# Altium footprint library Twomes_Monitor_PCB.PcbLib: 8 footprints
Each footprint in its own frame and in the unit in brackets; x right, y up, seen from the top. Pads: shape width x height; smd on the part's side, far side on the other; paste and mask are expansions set on the pad; w line width, h text height; cw(c..) or ccw(c..) is an arc to the next point about the centre after c.
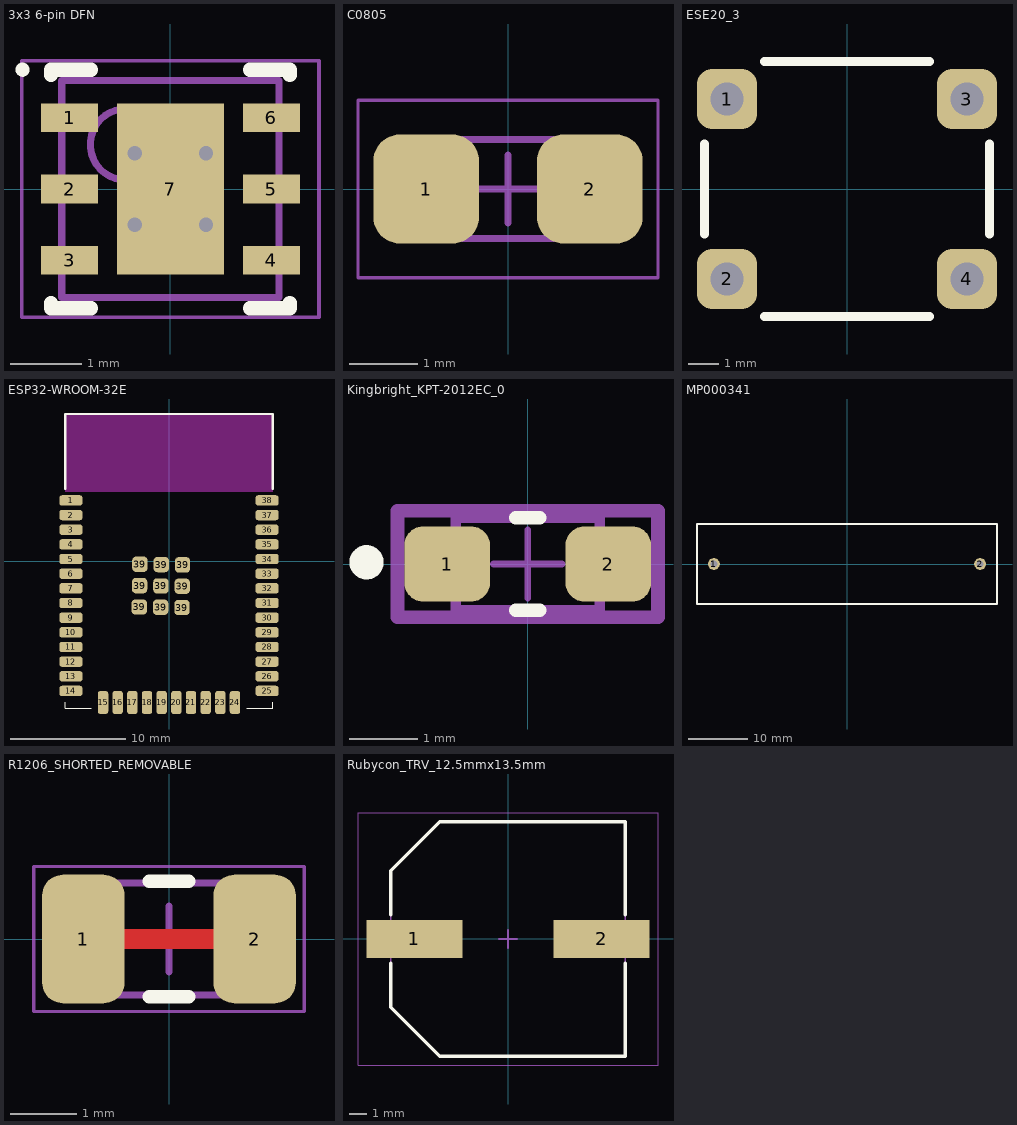
[diagram p0: the footprints below, top view; thin cyan lines are the x and y axes]

## 3x3 6-pin DFN [mm]
pads (7):
  rect 0.8x0.4 smd: 1(-1.415,1) 2(-1.415,0) 3(-1.415,-1) 4(1.415,-1) 5(1.415,0) 6(1.415,1)
  rect 1.5x2.4 smd: 7(0,0)
via 0.5,-0.5 diameter 0.5 hole 0.2
via -0.5,-0.5 diameter 0.5 hole 0.2
via 0.5,0.5 diameter 0.5 hole 0.2
via -0.5,0.5 diameter 0.5 hole 0.2
Top Overlay:
  circle w0.1: c-2.075,1.675 r0.05
  lines w0.2: -1.675,-1.6 -1.675,-1.675 -1.115,-1.675 ; -1.675,1.6 -1.675,1.675 -1.115,1.675 ; 1.115,-1.675 1.675,-1.675 1.675,-1.6 ; 1.115,1.675 1.675,1.675 1.675,1.6
Mechanical 13:
  circle w0.1: c-0.625,0.625 r0.5
  lines w0.1: -1.525,-1.525 1.525,-1.525 1.525,1.525 -1.525,1.525 -1.525,-1.525
Mechanical 15:
  lines w0.05: -2.085,-1.8 2.085,-1.8 2.085,1.8 -2.085,1.8 -2.085,-1.8
  lines w0.1: -0.5,0 0.5,0 ; 0,-0.5 0,0.5
3D body "User Library-DFN6-3x3x0_80.step": height 0.8, standoff 0, extent -1.5,-1.5 1.5,1.5

## C0805 [mm]
pads (2):
  rrect50% 1.55x1.6 smd: 1(-1.2,0) 2(1.2,0)
Mechanical 13:
  lines w0.1: -1.1,-0.725 1.1,-0.725 1.1,0.725 -1.1,0.725 -1.1,-0.725
Mechanical 15:
  lines w0.05: -2.2,-1.3 2.2,-1.3 2.2,1.3 -2.2,1.3 -2.2,-1.3
  lines w0.1: -0.5,0 0.5,0 ; 0,-0.5 0,0.5
3D body "C0805.step": height 1.4, standoff 0, extent -1.1,-0.725 1.1,0.725

## ESE20_3 [mm]
pads (4):
  rrect50% 2x2 hole 1.1: 1(-4,3) 2(-4,-3) 3(4,3) 4(4,-3)
Top Overlay:
  lines w0.3: -4.75,-1.5 -4.75,1.5 ; -2.75,-4.25 0,-4.25 2.75,-4.25 ; -2.75,4.25 0,4.25 2.75,4.25 ; 4.75,-1.5 4.75,1.5
3D body "ESE20D321.step": height 12.5, standoff -3.5, extent -4.548,-3.95 4.549,3.95

## ESP32­WROOM­32E [mm]
pads (47):
  rrect50% 2x0.9 smd: 1(-8.5,5.26) 2(-8.5,3.99) 3(-8.5,2.72) 4(-8.5,1.45) 5(-8.5,0.18) 6(-8.5,-1.09) 7(-8.5,-2.36) 8(-8.5,-3.63) 9(-8.5,-4.9) 10(-8.5,-6.17) 11(-8.5,-7.44) 12(-8.5,-8.71) 13(-8.5,-9.98) 14(-8.5,-11.25) 25(8.5,-11.25) 26(8.5,-9.98) 27(8.5,-8.71) 28(8.5,-7.44) 29(8.5,-6.17) 30(8.5,-4.9) 31(8.5,-3.63) 32(8.5,-2.36) 33(8.5,-1.09) 34(8.5,0.18) 35(8.5,1.45) 36(8.5,2.72) 37(8.5,3.99) 38(8.5,5.26)
  rrect50% 0.9x2 smd: 15(-5.715,-12.25) 16(-4.445,-12.25) 17(-3.175,-12.25) 18(-1.905,-12.25) 19(-0.635,-12.25) 20(0.635,-12.25) 21(1.905,-12.25) 22(3.175,-12.25) 23(4.445,-12.25) 24(5.715,-12.25)
  rrect50% 1.33x1.33 smd: 39(-2.575,-3.975) 39(-2.55,-2.125) 39(-2.525,-0.275) 39(-0.725,-4) 39(-0.7,-2.15) 39(-0.675,-0.3) 39(1.125,-4.025) 39(1.15,-2.175) 39(1.175,-0.325)
Top Overlay:
  lines w0.1: -9,-12.25 -9,-12.75 -6.75,-12.75 ; 6.75,-12.75 9,-12.75 9,-12.25
  lines w0.2: -9,6.25 -9,12.75 0,12.75 9,12.75 9,6.25
Keep-Out Layer:
  rectangle: -9,6 9,12.75
3D body "User Library-ESP32-WROOM.step": height 2.91, standoff -0.01, extent -9,-12.75 9,12.75

## Kingbright_KPT-2012EC_0 [mm]
pads (2):
  rrect50% 1.25x1.1 smd paste+0 mask+0: 1(-1.175,0) 2(1.175,0)
Top Overlay:
  circle w0.25: c-2.35,0.025 r0.125
  lines w0.2: -0.175,-0.675 0.175,-0.675 ; -0.175,0.675 0.175,0.675
Mechanical 10:
  lines w0.2: -1.9,-0.775 -1.9,0.775 1.9,0.775 1.9,-0.775 -1.9,-0.775
  text ".Designator" at 0,0 h1
Mechanical 12:
  lines w0.15: -1.05,-0.675 -1.05,0.675 1.05,0.675 1.05,-0.675 -1.05,-0.675
Mechanical 15:
  lines w0.1: -0.5,0 0.5,0 ; 0,-0.5 0,0.5
  lines w0.2: -1.9,-0.775 -1.9,0.775 1.9,0.775 1.9,-0.775 -1.9,-0.775
3D body "Diode_Kingbright_KPT-2012EC_eec.STEP": height 0.25, standoff 0, extent -1.9,-0.775 1.9,0.775

## MP000341 [mm]
pads (2):
  round 2 hole 1.2: 1(-22.4,0) 2(22.4,0)
Top Overlay:
  lines w0.3: -25.25,-6.75 0,-6.75 25.25,-6.75 25.25,0 25.25,6.75 0,6.75 -25.25,6.75 -25.25,0 -25.25,-6.75
3D body "User Library-bh-411-4p.step": height 12.5, standoff -3, extent -25.25,-6.75 25.25,6.75

## R1206_SHORTED_REMOVABLE [mm]
pads (2):
  rrect50% 1.25x1.95 smd: 1(-1.3,0) 2(1.3,0)
Top Layer:
  lines w0.3: -1.3,0 1.3,0
Top Overlay:
  lines w0.2: -0.3,-0.875 0.3,-0.875 ; -0.3,0.875 0.3,0.875
Mechanical 13:
  lines w0.1: -1.6,-0.85 -1.6,0.85 1.6,0.85 1.6,-0.85 -1.6,-0.85
Mechanical 15:
  lines w0.05: -2.05,-1.1 -2.05,1.1 2.05,1.1 2.05,-1.1 -2.05,-1.1
  lines w0.1: -0.5,0 0.5,0 ; 0,-0.5 0,0.5

## Rubycon_TRV_12.5mmx13.5mm [mm]
pads (2):
  rect 5.4x2.15 smd: 1(-5.275,0) 2(5.275,0)
Top Overlay:
  lines w0.2: -6.6,-1.375 -6.6,-3.838 -3.838,-6.6 6.6,-6.6 6.6,-1.375 ; -6.6,1.375 -6.6,3.837 -3.838,6.6 6.6,6.6 6.6,1.375
Mechanical 13:
  lines w0.1: -6.6,-3.838 -3.838,-6.6 6.6,-6.6 6.6,6.6 -3.838,6.6 -6.6,3.837 -6.6,-3.838
Mechanical 15:
  lines w0.05: -8.45,-7.1 -8.45,7.1 8.45,7.1 8.45,-7.1 -8.45,-7.1
  lines w0.1: -0.5,0 0.5,0 ; 0,-0.5 0,0.5
3D body "Rubycon_TRV_12.5mmx13.5mm.step": height 13, standoff 0, extent -7.15,-6.6 7.15,6.6